# Altium footprint library RPSLib.PcbLib: 199 footprints (part 1 of 13)
Each footprint in its own frame and in the unit in brackets; x right, y up, seen from the top. Pads: shape width x height; smd on the part's side, far side on the other; paste and mask are expansions set on the pad; w line width, h text height; cw(c..) or ccw(c..) is an arc to the next point about the centre after c.
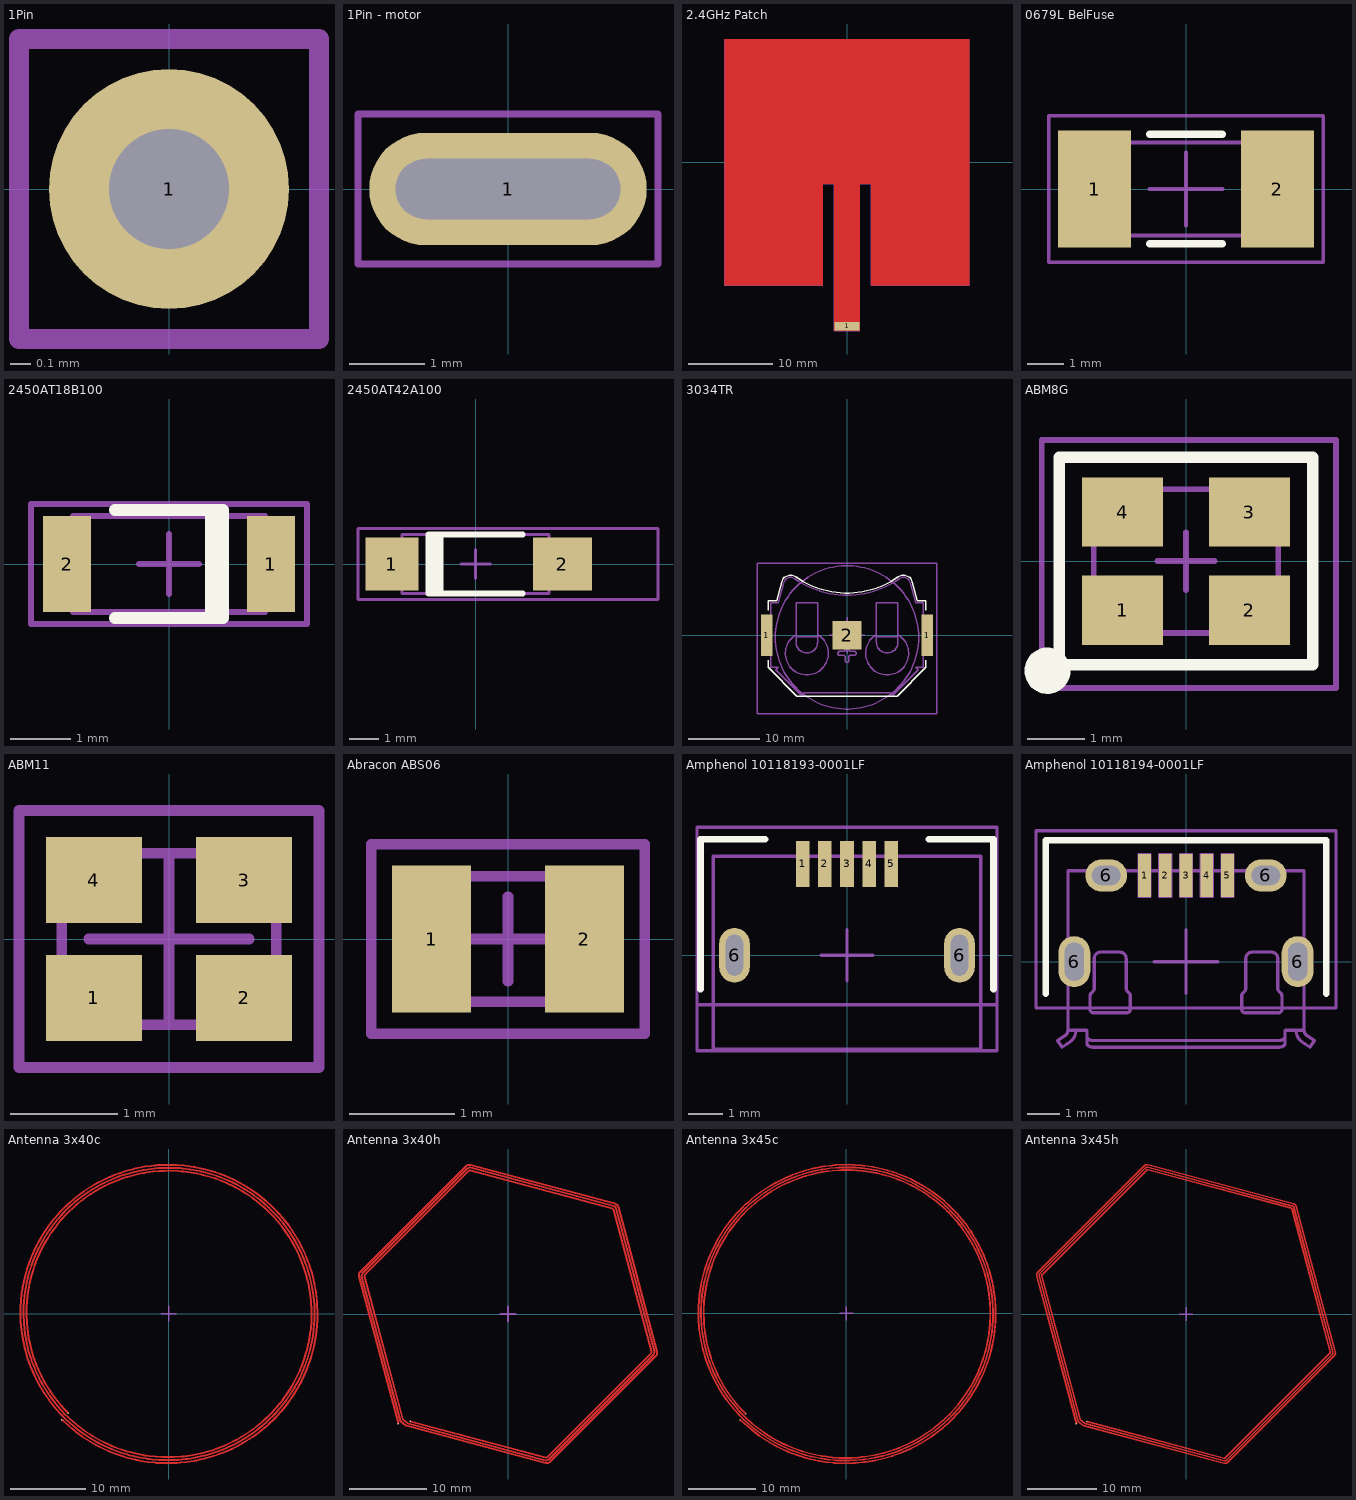
[diagram p0: the footprints below, top view; thin cyan lines are the x and y axes]

## 1Pin [mm]
pads (1):
  round 1.2 hole 0.6: 1(0,0)
Mechanical 15:
  lines w0.1: -0.75,-0.75 -0.75,0.75 0.75,0.75 0.75,-0.75 -0.75,-0.75

## 1Pin - motor [mm]
pads (1):
  oval 3.7x1.5 hole 0.8 slot 3 at 0 deg: 1(0,0)
Mechanical 15:
  lines w0.1: -2,-1 -2,1 2,1 2,-1 -2,-1

## 2.4GHz Patch [mm]
pads (1):
  rect 3x1 smd mask+0.07: 1(0,-19.5)
Top Layer:
  region: -14.5,-14.6 -14.5,14.6 14.5,14.6 14.5,-14.6 2.9,-14.6 2.9,-2.6 1.5,-2.6 1.5,-20 -1.5,-20 -1.5,-2.6 -2.9,-2.6 -2.9,-14.6
Mechanical 1:
  lines w0.05: -14.5,-14.6 -14.5,14.6 14.5,14.6 14.5,-14.6 2.9,-14.6 2.9,-2.6 1.5,-2.6 1.5,-20 -1.5,-20 -1.5,-2.6 -2.9,-2.6 -2.9,-14.6 -14.5,-14.6

## 0679L BelFuse [mm]
height 2.6
pads (2):
  rect 2x3.2 smd mask+0.07: 1(-2.5,0) 2(2.5,0)
Top Overlay:
  lines w0.2: -1,-1.5 1,-1.5 ; -1,1.5 1,1.5
Mechanical 13:
  lines w0.1: -3.05,-1.27 -3.05,1.27 3.05,1.27 3.05,-1.27 -3.05,-1.27
Mechanical 15:
  lines w0.1: -1,0 1,0 ; 0,-1 0,1 ; -3.75,-2 3.75,-2 3.75,2 -3.75,2 -3.75,-2
3D body "User Library-Fuse-2410.step": height 2.54, standoff 0, extent -3.05,-1.27 3.05,1.27

## 2450AT18B100 [mm] "2450 MHz Chip Antenna"
height 1.3
pads (2):
  rect 0.8x1.6 smd mask+0.07: 1(1.7,0) 2(-1.7,0)
Top Overlay:
  lines w0.2: -0.9,-0.9 0.8,-0.9 ; -0.9,0.9 0.8,0.9 ; 0.7,-0.9 0.7,0.9 ; 0.8,-0.9 0.8,0.9 ; 0.8,-0.9 0.9,-0.9 0.9,0.9 0.8,0.9
Mechanical 13:
  lines w0.1: -1.6,-0.8 1.6,-0.8 1.6,0.8 -1.6,0.8 -1.6,-0.8
Mechanical 15:
  lines w0.1: -0.5,0 0.5,0 ; 0,-0.5 0,0.5 ; -2.3,-1 2.3,-1 2.3,1 -2.3,1 -2.3,-1
3D body "2450AT18B100.stp": height 1.3, standoff 0, extent -1.6,-0.8 1.6,0.8

## 2450AT42A100 [mm] "2450 MHz Chip antenna"
height 1.3
pads (2):
  rect 1.8x1.8 smd mask+0.07: 1(-2.85,0)
  rect 2x1.8 smd mask+0.07: 2(2.95,0)
Top Overlay:
  lines w0.2: -1.5,-1 -1.5,1 ; -1.4,-1 -1.4,1 ; -1.3,-1 -1.3,1 ; -1.2,-1 -1.2,1 ; 1.6,-1 -1.6,-1 -1.6,1 ; 1.6,1 -1.6,1 ; -1.6,1 -1.6,1
Mechanical 13:
  lines w0.1: -2.5,-1 -2.5,1 2.5,1 2.5,-1 -2.5,-1
Mechanical 15:
  lines w0.1: -0.5,0 0.5,0 ; 0,-0.5 0,0.5 ; -4,-1.2 -4,1.2 6.2,1.2 6.2,-1.2 -4,-1.2
3D body "2450AT42A100.stp": height 1.1, standoff 0, extent -2.5,-1 2.5,1

## 3034TR [mm] "3034TR Battery Holder"
height 4.06
pads (3):
  rect 1.6x5.8 smd mask+0.07: 1(-11.2,0) 1(11.2,0)
  rect 4x4 smd mask+0.07: 2(0,0)
Top Overlay:
  lines w0.2: -11,-3.5 -11,-4.5 -7,-8.5 7,-8.5 11,-4.5 11,-3.5 ; -11,3.5 -11,4.8 -10.905,4.8 -10.105,4.8 -9.834,4.8 -9.127,7.401 cw(c-7.872,7.06) -7.122,8.122 ccw(c0,18.205) 7.122,8.122 cw(c7.872,7.06) 9.127,7.401 9.834,4.8 10.105,4.8 11,4.8 11,3.5
Mechanical 13:
  lines w0.2: -10.605,-2.54 -10.855,-2.54 -11.625,-2.54 -11.625,-0.51 -10.855,-0.51 -10.605,-0.51 ; -10.605,0.51 -10.855,0.51 -11.625,0.51 -11.625,2.54 -10.855,2.54 -10.605,2.54 ; 10.605,-2.54 10.855,-2.54 11.625,-2.54 11.625,-0.51 10.855,-0.51 10.605,-0.51 ; 10.605,0.51 10.855,0.51 11.625,0.51 11.625,2.54 10.855,2.54 10.605,2.54 ; -7.105,-0.243 -7.105,0.058 ; -7.105,-0.243 -7.105,-0.349 -7.105,-0.981 ccw(c-5.605,-0.981) -4.105,-0.981 -4.105,-0.349 -4.105,-0.243 ; -7.105,-0.243 -4.105,-0.243 ; -7.105,0.058 ccw(c-5.605,-2.54) -4.105,0.058 ; -7.105,0.058 -7.105,4.5 -4.105,4.5 -4.105,0.058 ; -4.105,-0.243 -4.105,0.058 ; 4.105,-0.243 4.105,0.058 ; 4.105,-0.243 4.105,-0.349 4.105,-0.981 ccw(c5.605,-0.981) 7.105,-0.981 7.105,-0.349 7.105,-0.243 ; 4.105,-0.243 7.105,-0.243 ; 4.105,0.058 ccw(c5.605,-2.54) 7.105,0.058 ; 4.105,0.058 4.105,4.5 7.105,4.5 7.105,0.058 ; 7.105,-0.243 7.105,0.058 ; -10.605,-4.5 -10.605,4.5 -10.105,4.5 -9.605,4.5 -8.837,7.322 cw(c-7.872,7.06) -7.295,7.877 ccw(c0,18.205) 7.295,7.877 cw(c7.872,7.06) 8.837,7.322 9.605,4.5 10.105,4.5 10.605,4.5 10.605,-4.5 10.105,-4.5 9.605,-4.5 9.959,-4.854 6.399,-8.414 6.045,-8.06 -6.045,-8.06 -6.399,-8.414 -9.959,-4.854 -9.605,-4.5 -10.105,-4.5 -10.605,-4.5 ; -1.268,-2.59 ccw(c-1.05,-2.59) -1.05,-2.808 -0.48,-2.808 cw(c-0.48,-3.02) -0.268,-3.02 -0.268,-3.59 ccw(c-0.05,-3.59) -0.05,-3.808 0.05,-3.808 ccw(c0.05,-3.59) 0.268,-3.59 0.268,-3.02 cw(c0.48,-3.02) 0.48,-2.808 1.05,-2.808 ccw(c1.05,-2.59) 1.268,-2.59 1.268,-2.49 ccw(c1.05,-2.49) 1.05,-2.272 0.48,-2.272 cw(c0.48,-2.06) 0.268,-2.06 0.268,-1.49 ccw(c0.05,-1.49) 0.05,-1.272 -0.05,-1.272 ccw(c-0.05,-1.49) -0.268,-1.49 -0.268,-2.06 cw(c-0.48,-2.06) -0.48,-2.272 -1.05,-2.272 ccw(c-1.05,-2.49) -1.268,-2.49 -1.268,-2.59
Mechanical 15:
  circle w0.2: c0,-0.316 r10
  lines w0.2: -2.5,0 2.5,0 ; 0,-2.5 0,2.5 ; -12.5,-11 -12.5,10 12.5,10 12.5,-11 -12.5,-11
3D body "3034TR.stp": height 4.06, standoff 0, extent -11.625,-8.413 11.625,8.058

## ABM8G [mm] "Abracon ABM8G Crystal"
height 1
pads (4):
  rect 1.4x1.2 smd mask+0.07: 1(-1.1,-0.85) 2(1.1,-0.85) 3(1.1,0.85) 4(-1.1,0.85)
Top Overlay:
  circle w0.4: c-2.4,-1.9 r0.2
  lines w0.2: -2.2,-1.8 2.2,-1.8 2.2,1.8 -2.2,1.8 -2.2,-1.8
Mechanical 13:
  lines w0.1: -1.6,-1.245 1.6,-1.245 1.6,1.245 -1.6,1.245 -1.6,-1.245
Mechanical 15:
  lines w0.1: -0.5,0 0.5,0 ; 0,-0.5 0,0.5 ; -2.5,-2.2 2.6,-2.2 2.6,2.1 -2.5,2.1 -2.5,-2.2
3D body "ABM8G.stp": height 0.99, standoff 0, extent -1.6,-1.245 1.6,1.245

## ABM11 [mm] "ABM11 Crystal"
height 0.5
pads (4):
  rect 0.9x0.8 smd mask+0.07: 1(-0.7,-0.55) 2(0.7,-0.55) 3(0.7,0.55) 4(-0.7,0.55)
Mechanical 3:
  lines w0.1: -0.75,0 0.75,0 ; 0,-0.75 0,0.75
Mechanical 13:
  lines w0.1: -1,-0.8 1,-0.8 1,0.8 -1,0.8 -1,-0.8
Mechanical 15:
  lines w0.1: -1.4,-1.2 1.4,-1.2 1.4,1.2 -1.4,1.2 -1.4,-1.2
3D body "ABM11.stp": height 0.59, standoff 0, extent -1,-0.8 1,0.8

## Abracon ABS06 [mm]
height 0.6
pads (2):
  rect 0.75x1.4 smd mask+0.07: 1(-0.725,0) 2(0.725,0)
Mechanical 13:
  lines w0.1: -1.003,-0.597 1.003,-0.597 1.003,0.597 -1.003,0.597 -1.003,-0.597
Mechanical 15:
  lines w0.1: -0.4,0 0.4,0 ; 0,-0.4 0,0.4 ; -1.3,-0.9 -1.3,0.9 1.3,0.9 1.3,-0.9 -1.3,-0.9
3D body "ABS06_norm.stp": height 0.61, standoff 0, extent -1.003,-0.597 1.003,0.597

## Amphenol 10118193-0001LF [mm] "USB Micro-B"
height 3
pads (7):
  rect 0.4x1.35 smd mask+0.07: 1(-1.3,2.675) 2(-0.65,2.675) 3(0,2.675) 4(0.65,2.675) 5(1.3,2.675)
  oval 0.9x1.6 hole 0.5 slot 1.2 at 90 deg mask+0.07: 6(-3.3,0) 6(3.3,0)
Top Overlay:
  lines w0.2: -4.3,-1 -4.3,3.4 -2.4,3.4 ; 2.4,3.4 4.3,3.4 4.3,-1
Mechanical 13:
  lines w0.1: -3.928,-2.761 3.928,-2.761 3.928,2.9 -3.928,2.9 -3.928,-2.761
Mechanical 15:
  lines w0.1: -4.4,-1.45 4.4,-1.45 ; -0.75,0 0.75,0 ; 0,-0.75 0,0.75 ; -4.4,-2.8 -4.4,3.75 4.4,3.75 4.4,-2.8 -4.4,-2.8
3D body "10118193-0001lfc.stp": height 2.86, standoff -0.74, extent -3.928,-2.761 3.928,2.9

## Amphenol 10118194-0001LF [mm]
height 2.35
pads (9):
  rect 0.4x1.35 smd mask+0.07: 1(-1.3,2.7) 2(-0.65,2.7) 3(0,2.7) 4(0.65,2.7) 5(1.3,2.7)
  oval 1x1.6 hole 0.6 slot 1.2 at 90 deg mask+0.07: 6(-3.5,0) 6(3.5,0)
  oval 1.3x1 hole 0.6 slot 0.9 at 0 deg mask+0.07: 6(-2.5,2.7) 6(2.5,2.7)
Top Overlay:
  lines w0.2: -4.4,-1 -4.4,3.8 4.4,3.8 4.4,-1
Mechanical 2:
  lines w0.05: -3.8,-0.3 ccw(c-3.5,-0.3) -3.5,-0.6 ccw(c-3.5,-0.3) -3.2,-0.3 ; -3.8,-0.3 -3.8,0.3 ; -3.8,-0.3 -3.2,0.3 ; -3.8,0.3 cw(c-3.5,0.3) -3.5,0.6 cw(c-3.5,0.3) -3.2,0.3 ; -3.8,0.3 -3.2,-0.3 ; -3.2,-0.3 -3.2,0.3 ; -2.65,2.4 cw(c-2.65,2.7) -2.95,2.7 cw(c-2.65,2.7) -2.65,3 ; -2.65,2.4 -2.35,2.4 ; -2.65,2.4 -2.35,3 ; -2.65,3 -2.35,3 ; -2.65,3 -2.35,2.4 ; -2.35,2.4 ccw(c-2.35,2.7) -2.05,2.7 ccw(c-2.35,2.7) -2.35,3 ; -1.5,2.025 -1.1,2.025 ; -1.5,2.025 -1.5,3.375 ; -1.5,2.025 -1.1,3.375 ; -1.5,3.375 -1.1,3.375 ; -1.5,3.375 -1.1,2.025 ; -1.1,2.025 -1.1,3.375 ; -0.85,2.025 -0.45,2.025 ; -0.85,2.025 -0.85,3.375 ; -0.85,2.025 -0.45,3.375 ; -0.85,3.375 -0.45,3.375 ; -0.85,3.375 -0.45,2.025 ; -0.45,2.025 -0.45,3.375 ; -0.2,2.025 0.2,2.025 ; -0.2,2.025 -0.2,3.375 ; -0.2,2.025 0.2,3.375 ; -0.2,3.375 0.2,3.375 ; -0.2,3.375 0.2,2.025 ; 0.2,2.025 0.2,3.375 ; 0.45,2.025 0.85,2.025 ; 0.45,2.025 0.45,3.375 ; 0.45,2.025 0.85,3.375 ; 0.45,3.375 0.85,3.375 ; 0.45,3.375 0.85,2.025 ; 0.85,2.025 0.85,3.375 ; 1.1,2.025 1.5,2.025 ; 1.1,2.025 1.1,3.375 ; 1.1,2.025 1.5,3.375 ; 1.1,3.375 1.5,3.375 ; 1.1,3.375 1.5,2.025 ; 1.5,2.025 1.5,3.375 ; 2.35,2.4 cw(c2.35,2.7) 2.05,2.7 cw(c2.35,2.7) 2.35,3 ; 2.35,2.4 2.65,2.4 ; 2.35,2.4 2.65,3 ; 2.35,3 2.65,3 ; 2.35,3 2.65,2.4 ; 2.65,2.4 ccw(c2.65,2.7) 2.95,2.7 ccw(c2.65,2.7) 2.65,3 ; 3.2,-0.3 ccw(c3.5,-0.3) 3.5,-0.6 ccw(c3.5,-0.3) 3.8,-0.3 ; 3.2,-0.3 3.2,0.3 ; 3.2,-0.3 3.8,0.3 ; 3.2,0.3 cw(c3.5,0.3) 3.5,0.6 cw(c3.5,0.3) 3.8,0.3 ; 3.2,0.3 3.8,-0.3 ; 3.8,-0.3 3.8,0.3
Mechanical 13:
  drawing of 514 lines, arcs and shapes, not listed
Mechanical 15:
  lines w0.1: -1,0 1,0 ; 0,-1 0,1 ; -4.7,-1.45 4.7,-1.45 4.7,4.1 -4.7,4.1 -4.7,-1.45
3D body "10118194-0001LF.stp": height 2.77, standoff -0.5, extent -4.025,-2.68 4.025,2.9

## Antenna 3x40c [mm] "Антенна спиральная 3 витка, 40 мм"
pads (2):
  rect 0.2x0.2 smd mask+0.07: 1(-14.225,-14.063) 2(-13.383,-13.203)
Top Layer:
  drawing of 1 lines, arcs and shapes, not listed
Mechanical 15:
  lines w0.2: -1,0 1,0 ; 0,-1 0,1

## Antenna 3x40h [mm] "Антенна гексагональная 3 витка, 40 мм"
pads (2):
  rect 0.2x0.2 smd mask+0.07: 1(-14.142,-14.142) 2(-12.611,-13.835)
Top Layer:
  region: 249 vertices and 0 holes, not listed, extent -19.349,-19.349 19.349,19.349
Mechanical 15:
  lines w0.2: -1,0 1,0 ; 0,-1 0,1

## Antenna 3x45c [mm] "Антенна спиральная 3 витка, 45 мм"
pads (2):
  rect 0.2x0.2 smd mask+0.07: 1(-15.91,-15.91) 2(-15.061,-15.061)
Top Layer:
  drawing of 1 lines, arcs and shapes, not listed
Mechanical 15:
  lines w0.2: -1,0 1,0 ; 0,-1 0,1

## Antenna 3x45h [mm] "Антенна гексагональная 3 витка, 45 мм"
pads (2):
  rect 0.2x0.2 smd mask+0.07: 1(-15.91,-15.91) 2(-14.378,-15.603)
Top Layer:
  region: 249 vertices and 0 holes, not listed, extent -21.764,-21.764 21.764,21.764
Mechanical 15:
  lines w0.2: -1,0 1,0 ; 0,-1 0,1